# Altium footprint library PCBLIB.PcbLib: 775 footprints (part 35 of 49)
Each footprint in its own frame and in the unit in brackets; x right, y up, seen from the top. Pads: shape width x height; smd on the part's side, far side on the other; paste and mask are expansions set on the pad; w line width, h text height; cw(c..) or ccw(c..) is an arc to the next point about the centre after c.
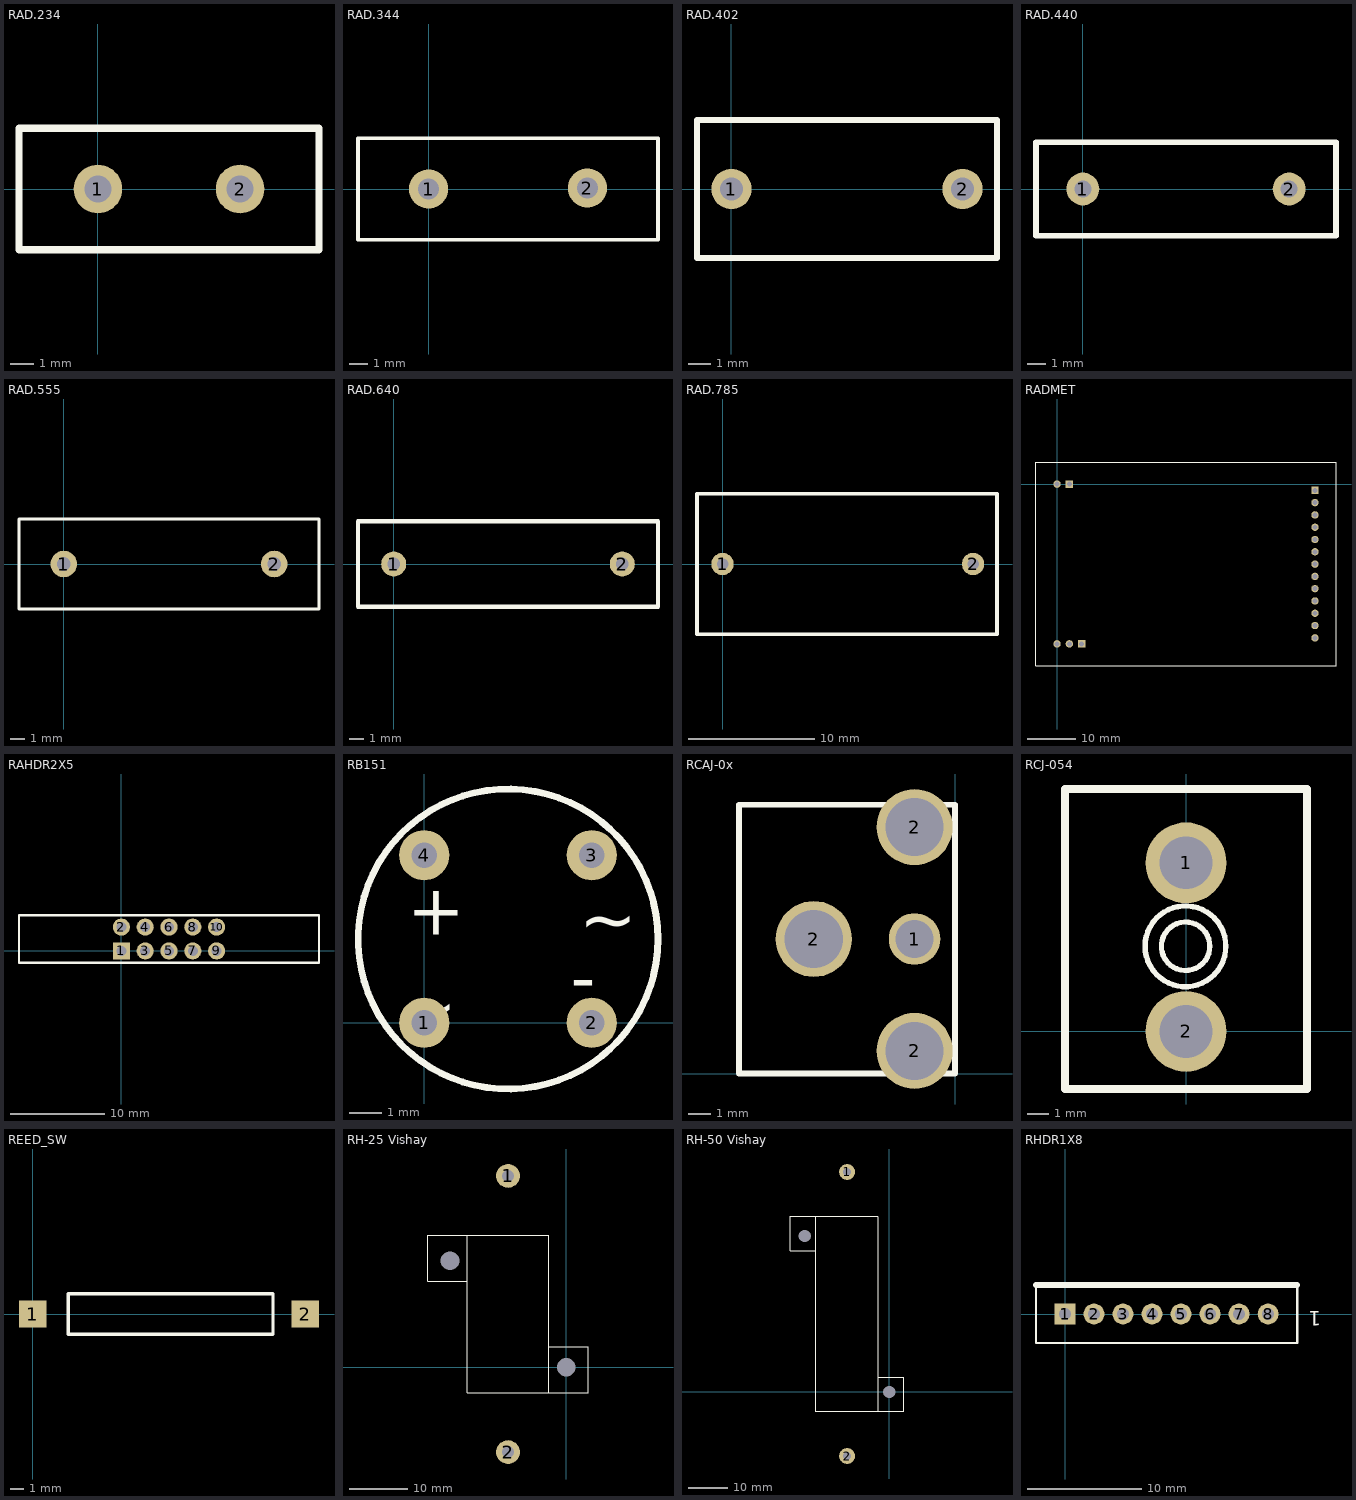
[diagram p34: the footprints below, top view; thin cyan lines are the x and y axes]

## RAD.234 [mil]
pads (2):
  round 80 hole 45: 1(0,0) 2(234,0)
TopOverlay:
  lines w12: -130,-100 -130,100 364,100 364,-100 -130,-100
Mechanical4:
  text ".325" at 0,0 h1

## RAD.344 [mil]
pads (2):
  round 85 hole 45: 1(0,0) 2(344,2)
TopOverlay:
  lines w8: -153,-110 497,-110 497,2 497,110 -153,110 -153,-110

## RAD.402 [mil]
pads (2):
  round 70 hole 40 unplated: 1(0,0) 2(402,0)
TopOverlay:
  lines w10: -60,-120 462,-120 462,120 -60,120 -60,-120

## RAD.440 [mil]
pads (2):
  round 70 hole 36: 1(0,0) 2(440,0)
TopOverlay:
  lines w12: -100,-100 -100,100 540,100 540,-100 -100,-100
Mechanical4:
  text ".325" at 0,0 h1

## RAD.555 [mil]
pads (2):
  round 70 hole 36: 1(0,0) 2(555.12,0)
TopOverlay:
  lines w7.87: -118.11,-118.11 0,-118.11 555.12,-118.11 673.23,-118.11 673.23,118.11 555.12,118.11 0,118.11 -118.11,118.11 -118.11,-118.11
Mechanical4:
  text ".325" at 0,0 h1

## RAD.640 [mil]
pads (2):
  round 70 hole 36: 1(0,0) 2(640,0)
TopOverlay:
  lines w12: -100,-120 740,-120 740,120 -100,120 -100,-120
Mechanical4:
  text ".325" at 0,0 h1

## RAD.785 [mil]
pads (2):
  round 70 hole 36: 1(0,0) 2(785,0)
TopOverlay:
  lines w12: -80,-220 -80,220 860,220 860,-220 -80,-220
Mechanical4:
  text ".325" at 0,0 h1

## RADMET [mil] "RADIO MODULE"
pads (18):
  rect 60x60 hole 40: A1(100,0) B1(200,-1299.21) C1(2098.43,-50.39)
  round 60 hole 40: A2(0,0) B2(100,-1299.21) B3(0,-1299.21) C2(2098.43,-150.39) C3(2098.43,-250.39) C4(2098.43,-350.39) C5(2098.43,-450.39) C6(2098.43,-550.39) C7(2098.43,-650.39) C8(2098.43,-750.39) C9(2098.43,-850.39) C10(2098.43,-950.39) C11(2098.43,-1050.39) C12(2098.43,-1150.39) C13(2098.43,-1250.39)
TopOverlay:
  lines w10: -171.26,-1476.38 2269.68,-1476.38 2269.68,177.17 -171.26,177.17 -171.26,-1476.38

## RAHDR2X5 [mil]
pads (10):
  rect 72x72 hole 42: 1(0,0)
  round 72 hole 42: 2(0,100) 3(100,0) 4(100,100) 5(200,0) 6(200,100) 7(300,0) 8(300,100) 9(400,0) 10(400,100)
TopOverlay:
  lines w10: 58.33,-50 250,-50 ; 250,-50 -430,-50 -430,150 250,150 830,150 830,-50 250,-50
Mechanical4:
  text ".341" at -0.27,0 h1
  text ".341" at 0,0 h1

## RB151 [mil] "Full Wave Rectifier"
height 197
pads (4):
  round 60 hole 30: 1(0,0) 2(200,0) 3(200,200) 4(0,200)
TopOverlay:
  circle w8: c100,100 r179
  text "-" at 175,25 h60
  text "+" at -20,105 h60
  text "~" at -30,-10 h60
  text "~" at 185,95 h60

## RCAJ-0x [mm]
pads (4):
  round 2.3 hole 1.7: 1(-1.809,6.009)
  round 3.4 hole 2.6: 2(-6.309,6.009) 2(-1.809,1.009) 2(-1.809,11.009)
TopOverlay:
  lines w0.254: -9.652,0 -9.652,12 0,12 0,0 -9.652,0

## RCJ-054 [mil]
pads (2):
  round 150 hole 98: 1(0,313) 2(0,0)
TopOverlay:
  circle w10: c-0.72,158 r45
  circle w10: c-1,158 r75
  lines w15: -225,-107 -225,450 225,450 225,-107 -225,-107

## REED_SW [mil]
height 393.7
pads (2):
  rect 80x80 smd: 1(0,0) 2(800,0)
TopOverlay:
  lines w10: 105,-60 105,60 705,60 705,-60 105,-60

## RH-25 Vishay [mil]
height 546
pads (4):
  round 160 hole 80: 1(-390.5,1288.5) 2(-390.5,-569.5)
  round 1 on Top hole 125: MH(-781,719) MH(0,0)
TopOverlay:
  lines w8: -930.5,580.21 -930.5,605.65 -930.5,799.31 -930.5,890.24 ; -930.24,890.5 -898.1,890.5 -115,890.5 -115,799.31 -115,102.73 -115,-169.44 ; -929.62,579.33 -666,579.33 ; -666,886.9 -666,605.65 -666,-87.93 -666,-171.4 -665.9,-171.5 -627.12,-171.5 101.73,-171.5 148.9,-171.5 148.9,-95.53 ; -114.09,139.67 -99.44,139.67 101.73,139.67 148.8,139.67 149,139.47 149,108.74 149,-95.43

## RH-50 Vishay [mil]
height 610
pads (4):
  round 160 hole 80: 1(-422,2203) 2(-422,-641)
  round 1 on Top hole 125: MH(-844,1562) MH(0,0)
TopOverlay:
  lines w8: -992.81,1414 -737,1414 ; -992,1414.81 -992,1439.15 -992,1759.12 -990.88,1758 -896.96,1758 -113.86,1758 ; -737,-195.43 -737,1758 ; -736.37,-194.8 -665.26,-194.8 148,-194.8 148,108.72 148,147.29 ; -107,-194.8 -107,1752.94 ; -107,148 147.29,148

## RHDR1X8 [mil]
pads (8):
  rect 72x72 hole 42: 1(0,0)
  round 72 hole 42: 2(100,0) 3(200,0) 4(300,0) 5(400,0) 6(500,0) 7(600,0) 8(700,0)
TopOverlay:
  lines w8: -100,100 -100,-100 800,-100 800,100
  lines w20: -100,100 800,100
  text "1" at 884,9 h50
Mechanical4:
  text ".341" at 0,0 h1